# Altium footprint library NASCO 3D PCBLIB.PcbLib: 108 footprints (part 5 of 7)
Each footprint in its own frame and in the unit in brackets; x right, y up, seen from the top. Pads: shape width x height; smd on the part's side, far side on the other; paste and mask are expansions set on the pad; w line width, h text height; cw(c..) or ccw(c..) is an arc to the next point about the centre after c.
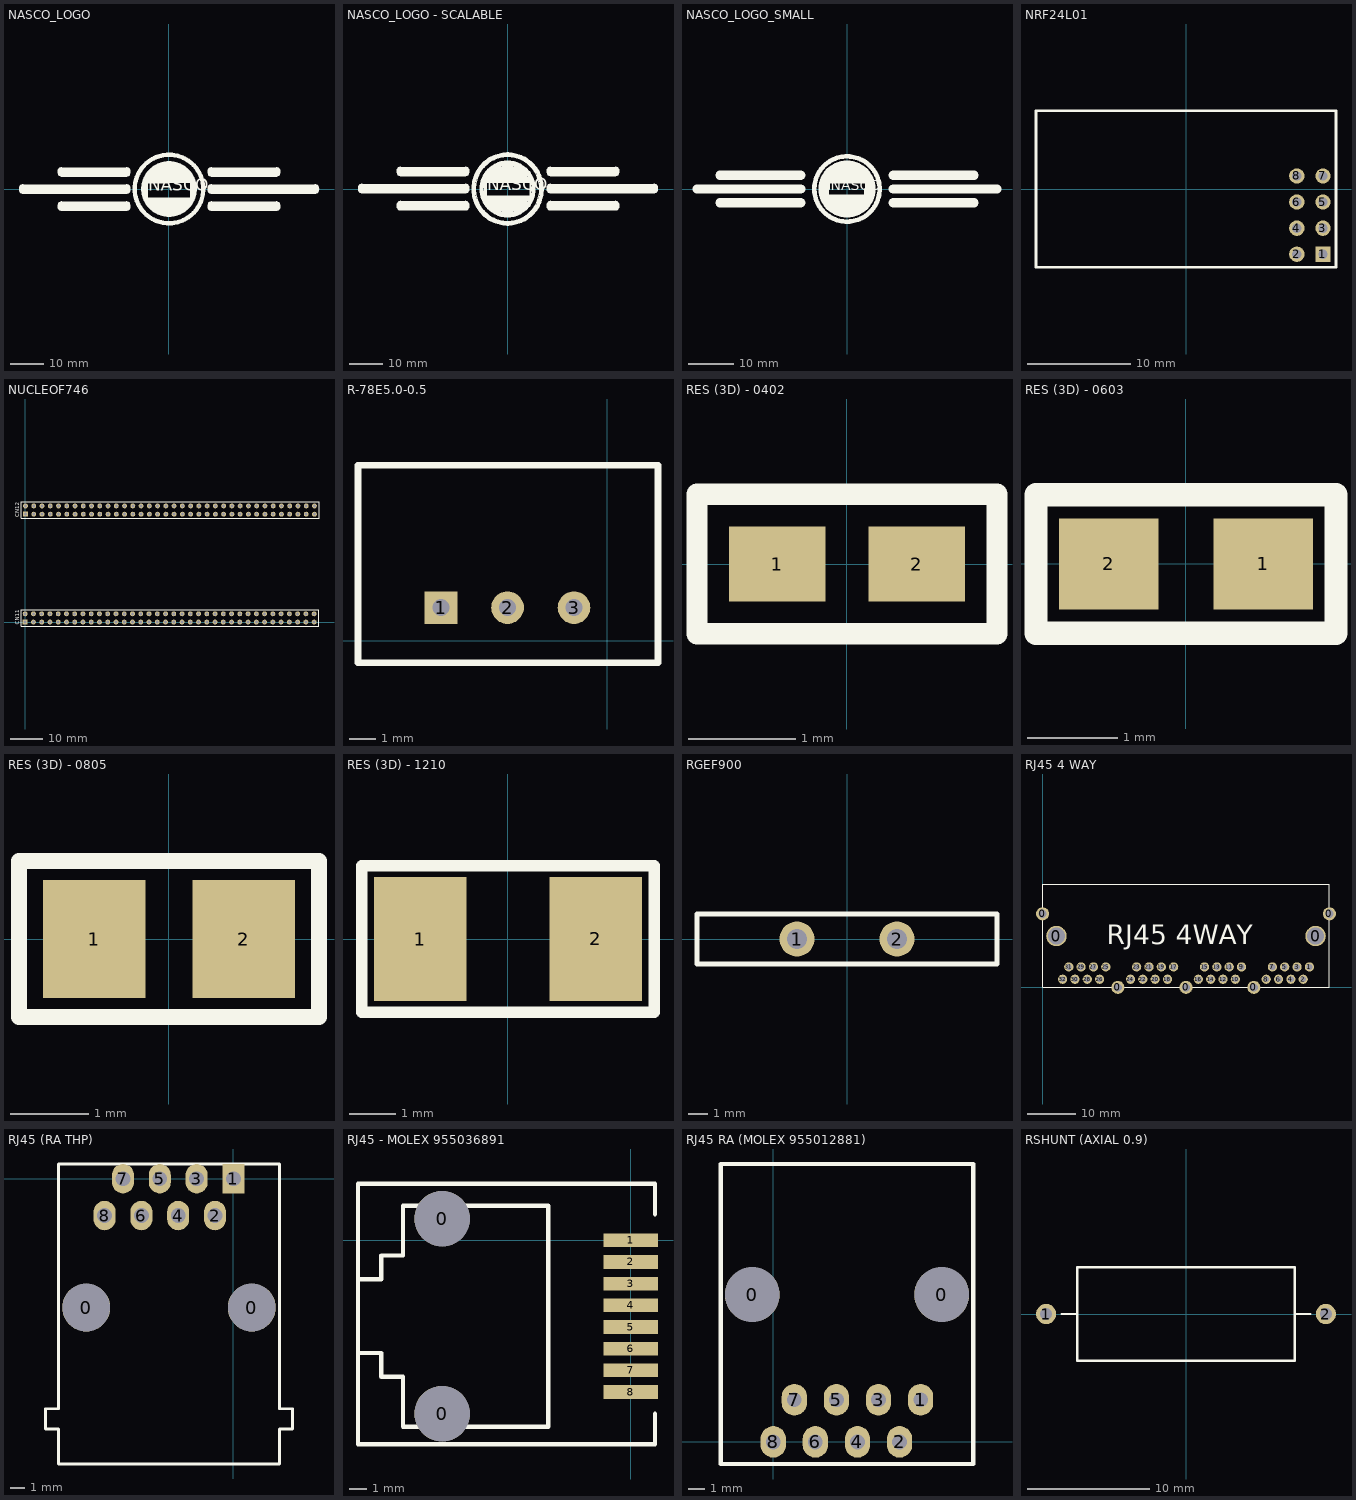
[diagram p4: the footprints below, top view; thin cyan lines are the x and y axes]

## NASCO_LOGO [mm]
Top Overlay:
  drawing of 42 lines, arcs and shapes, not listed
  text "NASCO" at -5.972,-1.769 h6.35

## NASCO_LOGO - SCALABLE [mm]
Top Overlay:
  drawing of 39 lines, arcs and shapes, not listed
  text "NASCO" at -5.972,-1.769 h6.35

## NASCO_LOGO_SMALL [mm]
Top Overlay:
  drawing of 16 lines, arcs and shapes, not listed
  text "NASCO" at -3.556,-1.016 h3.81

## NRF24L01 [mm]
pads (8):
  rect 1.5x1.5 hole 0.9: 1(13.335,-6.35)
  round 1.5 hole 0.9: 2(10.795,-6.35) 3(13.335,-3.81) 4(10.795,-3.81) 5(13.335,-1.27) 6(10.795,-1.27) 7(13.335,1.27) 8(10.795,1.27)
Top Overlay:
  lines w0.254: -14.605,-7.62 14.605,-7.62 14.605,7.62 -14.605,7.62 -14.605,-7.62

## NUCLEOF746 [mm] "STM Nucleo 746"
pads (144):
  rect 1.5x1.5 hole 0.9: 1(0,0) 73(0.1,33.2)
  round 1.5 hole 0.9: 2(0,2.54) 3(2.54,0) 4(2.54,2.54) 5(5.08,0) 6(5.08,2.54) 7(7.62,0) 8(7.62,2.54) 9(10.16,0) 10(10.16,2.54) 11(12.7,0) 12(12.7,2.54) 13(15.24,0) 14(15.24,2.54) 15(17.78,0) 16(17.78,2.54) 17(20.32,0) 18(20.32,2.54) 19(22.86,0) 20(22.86,2.54) 21(25.4,0) 22(25.4,2.54) 23(27.94,0) 24(27.94,2.54) 25(30.48,0) 26(30.48,2.54) 27(33.02,0) 28(33.02,2.54) 29(35.56,0) 30(35.56,2.54) 31(38.1,0) 32(38.1,2.54) 33(40.64,0) 34(40.64,2.54) 35(43.18,0) 36(43.18,2.54) 37(45.72,0) 38(45.72,2.54) 39(48.26,0) 40(48.26,2.54) 41(50.8,0) 42(50.8,2.54) 43(53.34,0) 44(53.34,2.54) 45(55.88,0) 46(55.88,2.54) 47(58.42,0) 48(58.42,2.54) 49(60.96,0) 50(60.96,2.54) 51(63.5,0) 52(63.5,2.54) 53(66.04,0) 54(66.04,2.54) 55(68.58,0) 56(68.58,2.54) 57(71.12,0) 58(71.12,2.54) 59(73.66,0) 60(73.66,2.54) 61(76.2,0) 62(76.2,2.54) 63(78.74,0) 64(78.74,2.54) 65(81.28,0) 66(81.28,2.54) 67(83.82,0) 68(83.82,2.54) 69(86.36,0) 70(86.36,2.54) 71(88.9,0) 72(88.9,2.54) 74(0.1,35.74) 75(2.64,33.2) 76(2.64,35.74) 77(5.18,33.2) 78(5.18,35.74) 79(7.72,33.2) 80(7.72,35.74) 81(10.26,33.2) 82(10.26,35.74) 83(12.8,33.2) 84(12.8,35.74) 85(15.34,33.2) 86(15.34,35.74) 87(17.88,33.2) 88(17.88,35.74) 89(20.42,33.2) 90(20.42,35.74) 91(22.96,33.2) 92(22.96,35.74) 93(25.5,33.2) 94(25.5,35.74) 95(28.04,33.2) 96(28.04,35.74) 97(30.58,33.2) 98(30.58,35.74) 99(33.12,33.2) 100(33.12,35.74) 101(35.66,33.2) 102(35.66,35.74) 103(38.2,33.2) 104(38.2,35.74) 105(40.74,33.2) 106(40.74,35.74) 107(43.28,33.2) 108(43.28,35.74) 109(45.82,33.2) 110(45.82,35.74) 111(48.36,33.2) 112(48.36,35.74) 113(50.9,33.2) 114(50.9,35.74) 115(53.44,33.2) 116(53.44,35.74) 117(55.98,33.2) 118(55.98,35.74) 119(58.52,33.2) 120(58.52,35.74) 121(61.06,33.2) 122(61.06,35.74) 123(63.6,33.2) 124(63.6,35.74) 125(66.14,33.2) 126(66.14,35.74) 127(68.68,33.2) 128(68.68,35.74) 129(71.22,33.2) 130(71.22,35.74) 131(73.76,33.2) 132(73.76,35.74) 133(76.3,33.2) 134(76.3,35.74) 135(78.84,33.2) 136(78.84,35.74) 137(81.38,33.2) 138(81.38,35.74) 139(83.92,33.2) 140(83.92,35.74) 141(86.46,33.2) 142(86.46,35.74) 143(89,33.2) 144(89,35.74)
Top Overlay:
  lines w0.2: -1.27,-1.27 -1.27,3.81 90.3,3.81 90.3,-1.27 -1.27,-1.27 ; -1.17,31.93 90.4,31.93 90.4,37.01 -1.17,37.01 -1.17,31.93
  text "CN12" at -1.9,32.2 h1.27
  text "CN11" at -1.9,-0.8 h1.27

## R-78E5.0-0.5 [mm] "RECOM R-78E5.0-0.5 DC-DC CONVERTER"
pads (3):
  rect 1.25x1.25 hole 0.65: 1(-6.35,1.27)
  round 1.25 hole 0.65: 2(-3.81,1.27) 3(-1.27,1.27)
Top Overlay:
  lines w0.254: 1.905,6.712 1.94,6.712 ; 1.94,6.712 1.94,-0.838 -9.525,-0.838 -9.525,6.712 1.94,6.712
3D body "Recom R-78xx-05.step": height 10.22, standoff -3.06, extent -9.56,-0.838 1.94,6.712

## RES (3D) - 0402 [mm] "Chip Capacitor; Body 1.0 x 0.5 mm (LxW typ)"
height 0.55
pads (2):
  rect 0.9x0.7 smd: 1(-0.65,0) 2(0.65,0)
Top Overlay:
  lines w0.2: -1.4,-0.65 -0.825,-0.65 0.825,-0.65 1.4,-0.65 1.4,-0.25 1.4,0.25 1.4,0.65 0.825,0.65 -0.825,0.65 -1.4,0.65 -1.4,0.25 -1.4,-0.25 -1.4,-0.65
3D body: height 0.5, standoff 0, extent -0.675,-0.25 -0.375,0.25
3D body: height 0.5, standoff 0, extent 0.375,-0.25 0.675,0.25
3D body: height 0.5, standoff 0, extent -0.375,-0.25 0.375,0.25

## RES (3D) - 0603 [mm]
height 0.025
pads (2):
  rect 1.1x1 smd: 1(0.85,0) 2(-0.85,0)
Top Overlay:
  lines w0.254: -1.651,-0.762 -1.651,0.762 1.651,0.762 1.651,-0.762 -1.651,-0.762
3D body: height 0.92, standoff 0, extent -0.5,-0.4 0.5,0.4
3D body: height 0.92, standoff 0, extent 0.5,-0.4 0.8,0.4
3D body: height 0.92, standoff 0, extent -0.8,-0.4 -0.5,0.4

## RES (3D) - 0805 [mm]
height 1.2
pads (2):
  rect 1.3x1.5 smd: 1(-0.95,0) 2(0.95,0)
Top Overlay:
  lines w0.2: -1.905,-0.65 -1.905,-0.991 ; -1.372,-0.991 -1.905,-0.991 ; 1.372,-0.991 1.905,-0.991 ; -1.905,-0.991 -1.905,0.65 -1.905,0.991 -1.372,0.991 1.372,0.991 1.905,0.991 1.905,0.65 1.905,-0.65 1.905,-0.991 ; -1.905,-0.991 1.905,-0.991
3D body: height 1, standoff 0, extent 0.5,-0.625 1,0.625
3D body: height 1, standoff 0, extent -0.5,-0.625 0.5,0.625
3D body: height 1, standoff 0, extent -1,-0.625 -0.5,0.625

## RES (3D) - 1210 [mm] "Chip Diode; Body 3.2 x 2.5 mm (LxW typ)"
height 1.35
pads (2):
  rect 2x2.7 smd: 1(-1.905,0) 2(1.905,0)
Top Overlay:
  lines w0.254: -3.175,-0.635 -3.175,1.587 0,1.587 3.175,1.587 3.175,-0.635 ; -3.175,0.635 -3.175,-1.587 0,-1.587 3.175,-1.587 3.175,0.635
3D body "User Library-1210(3225M) Res.step": height 1.7, standoff 0, extent -2,-1.244 2,1.245

## RGEF900 [mil] "POLYSWITCH, 9A, RGEF900"
pads (2):
  round 70 hole 40: 1(-100,0) 2(100,0)
Top Overlay:
  lines w10: -300,-50 -300,50 -100,50 0,50 300,50 300,-50 0,-50 -300,-50
3D body: height 25, standoff 0, extent 83.13,-16.94 115,15
3D body: height 25, standoff 0, extent -116.87,-16.94 -85,15
3D body: height 875, standoff 25, extent -300,-50 300,50

## RJ45 4 WAY [mm] "RJ45 4 Way Horizontal"
height 13.7
pads (39):
  round 2.7 hole 1.7: 0(0,15.14) 0(15.5,0) 0(29.53,0) 0(43.5,0) 0(59.06,15.14)
  round 4.2 hole 3.5: 0(2.86,10.57) 0(56.2,10.57)
  round 1.9 hole 1.2: 1(54.93,4.22) 2(53.66,1.68) 3(52.39,4.22) 4(51.12,1.68) 5(49.85,4.22) 6(48.58,1.68) 7(47.31,4.22) 8(46.04,1.68) 9(40.96,4.22) 10(39.69,1.68) 11(38.42,4.22) 12(37.15,1.68) 13(35.88,4.22) 14(34.61,1.68) 15(33.34,4.22) 16(32.07,1.68) 17(26.99,4.22) 18(25.72,1.68) 19(24.45,4.22) 20(23.18,1.68) 21(21.91,4.22) 22(20.64,1.68) 23(19.37,4.22) 24(18.1,1.68) 25(13.02,4.22) 26(11.75,1.68) 27(10.48,4.22) 28(9.21,1.68) 29(7.94,4.22) 30(6.67,1.68) 31(5.4,4.22) 32(4.13,1.68)
Top Overlay:
  lines w0.254: 0,0 59.06,0 59.06,21.27 0,21.27 0,0
  text "RJ45 4WAY" at 13.2,8.9 h4

## RJ45 (RA THP) [mil] "MOLEX 95009-2881 (MOUSER 538-95009-2881)"
pads (10):
  round 130 hole 130 unplated: 0(-400,-350) 0(50,-350)
  rect 60x80 hole 40: 1(0,0)
  oval 60x80 hole 40: 2(-50,-100) 3(-100,0) 4(-150,-100) 5(-200,0) 6(-250,-100) 7(-300,0) 8(-350,-100)
Top Overlay:
  lines w7.87: -475,-770 -475,-775 ; -475,-775 -475,-680 -510,-680 -510,-625 -475,-625 -475,40 125,40 125,-625 160,-625 160,-680 125,-680 125,-775 -475,-775
3D body "950092881.stp": height 630.52, standoff -135.23, extent -508.27,-772.23 158.66,37.61

## RJ45 - MOLEX 955036891 [mm] "MOLEX (95503-6891) - MOUSER 538-95503-6891"
pads (10):
  round 3.25 hole 3.25 unplated: 0(-11.049,-10.16) 0(-11.049,1.27)
  rect 3.2x0.8 smd: 1(0,0) 2(0,-1.27) 3(0,-2.54) 4(0,-3.81) 5(0,-5.08) 6(0,-6.35) 7(0,-7.62) 8(0,-8.89)
Top Overlay:
  lines w0.254: -15.973,-6.604 -14.605,-6.604 -14.605,-8.001 -13.335,-8.001 -13.335,-10.922 -4.826,-10.922 -4.826,2.032 -13.335,2.032 -13.335,-0.889 -14.605,-0.889 -14.605,-2.286 -15.973,-2.286 ; 1.426,-10.16 1.426,-11.938 -15.973,-11.938 -15.973,3.302 1.426,3.302 1.426,1.524
3D body "955036891.stp": height 15.72, standoff -2.98, extent -15.973,-11.938 1.397,3.302

## RJ45 RA (MOLEX 955012881) [mil] "RJ45 MOLEX 955012881"
pads (10):
  round 130 hole 130 unplated: 0(-50,350) 0(400,350)
  oval 60x75 hole 35: 1(350,100) 2(300,0) 3(250,100) 4(200,0) 5(150,100) 6(100,0) 7(50,100) 8(0,0)
Top Overlay:
  lines w10: -124.87,-52.48 475.13,-52.48 475.13,660.11 -124.87,660.11 -124.87,-52.48
3D body "MOLEX 955012881.stp": height 453.36, standoff -129.32, extent -124.87,-52.48 475.13,660.11

## RSHUNT (AXIAL 0.9) [mm] "Axial Device, Thru-Hole; 2 Leads; 0.9 in Pin Spacing"
height 5.08
pads (2):
  round 1.65 hole 1: 1(-11.43,0) 2(11.43,0)
Top Overlay:
  lines w0.2: -10.16,0 -8.89,0 ; 8.89,0 10.16,0 ; -8.89,-3.81 -8.89,3.81 8.89,3.81 8.89,-3.81 -8.89,-3.81
3D body: height 7.61, standoff 0.01, extent -8.89,-3.78 8.89,3.81